# Altium footprint library WR-TBL_Rising Cage Clamp.PcbLib: 435 footprints (part 13 of 28)
Each footprint in its own frame and in the unit in brackets; x right, y up, seen from the top. Pads: shape width x height; smd on the part's side, far side on the other; paste and mask are expansions set on the pad; w line width, h text height; cw(c..) or ccw(c..) is an arc to the next point about the centre after c.
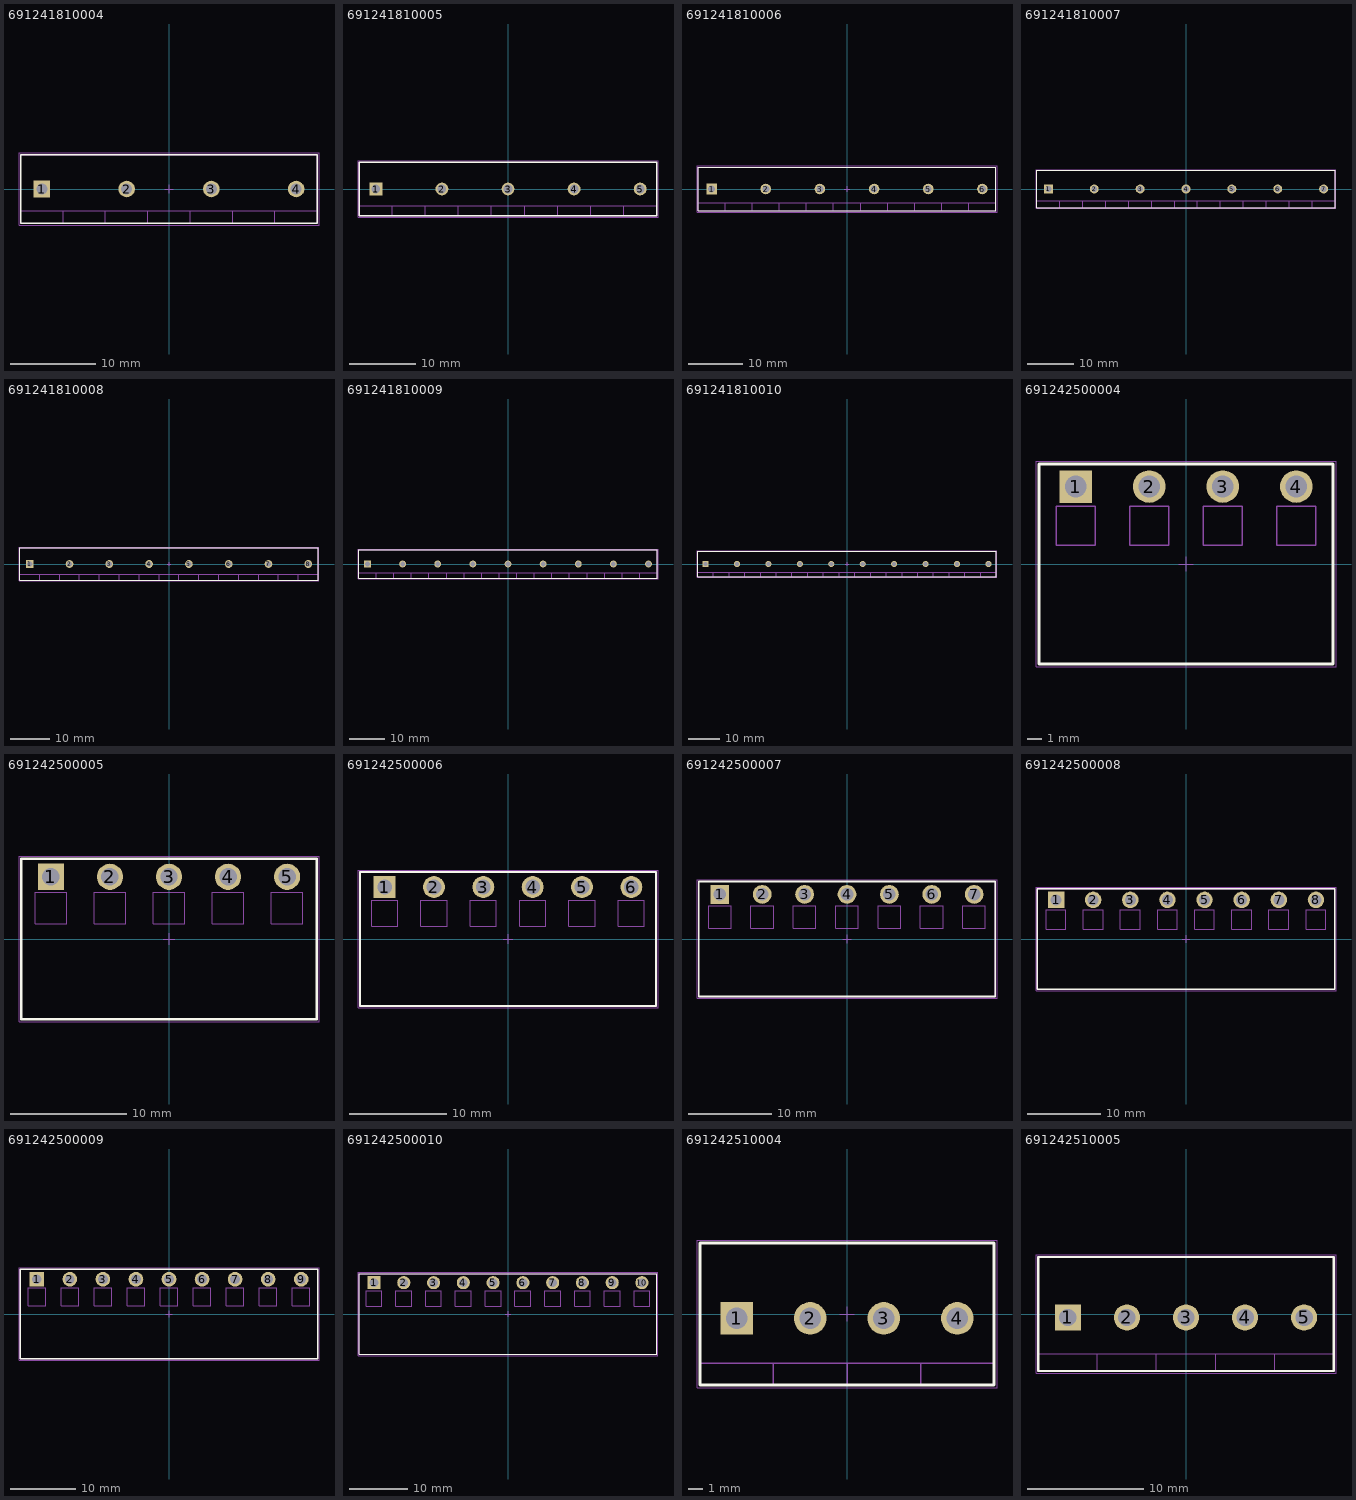
[diagram p12: the footprints below, top view; thin cyan lines are the x and y axes]

## 691241810004 [mm] "10.00mm Horizontal Cable Entry with Rising Cage Clamp, 04p"
height 10
pads (4):
  rect 1.95x1.95 hole 1.3: 1(-15,0)
  round 1.95 hole 1.3: 2(-5,0) 3(5,0) 4(15,0)
Top Overlay:
  lines w0.2: -17.5,-4.05 -17.5,4.05 17.5,4.05 17.5,-4.05 -17.5,-4.05
Mechanical 13:
  lines w0.1: -17.5,-2.55 17.5,-2.55 ; -12.5,-4.05 -12.5,-2.55 ; -7.5,-4.05 -7.5,-2.55 ; -2.5,-4.05 -2.5,-2.55 ; 2.5,-4.05 2.5,-2.55 ; 7.5,-4.05 7.5,-2.55 ; 12.5,-4.05 12.5,-2.55 ; -17.5,-4.05 17.5,-4.05 17.5,4.05 -17.5,4.05 -17.5,-4.05
Mechanical 15:
  lines w0.05: -0.5,0 0.5,0 ; 0,-0.5 0,0.5 ; -17.7,-4.25 -17.7,4.25 17.7,4.25 17.7,-4.25 -17.7,-4.25
3D body "691241810004.stp": height 10.1, standoff -3.4, extent -17.5,-4.05 17.5,4.05

## 691241810005 [mm] "10.00mm Horizontal Cable Entry with Rising Cage Clamp, 05p"
height 10
pads (5):
  rect 1.95x1.95 hole 1.3: 1(-20,0)
  round 1.95 hole 1.3: 2(-10,0) 3(0,0) 4(10,0) 5(20,0)
Top Overlay:
  lines w0.2: -22.5,-4.05 22.5,-4.05 22.5,4.05 -22.5,4.05 -22.5,-4.05
Mechanical 13:
  lines w0.1: -22.5,-2.55 22.5,-2.55 ; -17.5,-4.05 -17.5,-2.55 ; -12.5,-4.05 -12.5,-2.55 ; -7.5,-4.05 -7.5,-2.55 ; -2.5,-4.05 -2.5,-2.55 ; 2.5,-4.05 2.5,-2.55 ; 7.5,-4.05 7.5,-2.55 ; 12.5,-4.05 12.5,-2.55 ; 17.5,-4.05 17.5,-2.55 ; -22.5,-4.05 -22.5,4.05 22.5,4.05 22.5,-4.05 -22.5,-4.05
Mechanical 15:
  lines w0.05: -0.5,0 0.5,0 ; 0,-0.5 0,0.5 ; -22.7,-4.25 22.7,-4.25 22.7,4.25 -22.7,4.25 -22.7,-4.25
3D body "691241810005.stp": height 10.1, standoff -3.4, extent -22.5,-4.05 22.5,4.05

## 691241810006 [mm] "10.00mm Horizontal Cable Entry with Rising Cage Clamp, 06p"
height 10
pads (6):
  rect 1.95x1.95 hole 1.3: 1(-25,0)
  round 1.95 hole 1.3: 2(-15,0) 3(-5,0) 4(5,0) 5(15,0) 6(25,0)
Top Overlay:
  lines w0.2: -27.5,-4.05 -27.5,4.05 27.5,4.05 27.5,-4.05 -27.5,-4.05
Mechanical 13:
  lines w0.1: -27.5,-2.55 27.5,-2.55 ; -22.5,-4.05 -22.5,-2.55 ; -17.5,-4.05 -17.5,-2.55 ; -12.5,-4.05 -12.5,-2.55 ; -7.5,-4.05 -7.5,-2.55 ; -2.5,-4.05 -2.5,-2.55 ; 2.5,-4.05 2.5,-2.55 ; 7.5,-4.05 7.5,-2.55 ; 12.5,-4.05 12.5,-2.55 ; 17.5,-4.05 17.5,-2.55 ; 22.5,-4.05 22.5,-2.55 ; -27.5,-4.05 27.5,-4.05 27.5,4.05 -27.5,4.05 -27.5,-4.05
Mechanical 15:
  lines w0.05: -0.5,0 0.5,0 ; 0,-0.5 0,0.5 ; -27.7,-4.25 -27.7,4.25 27.7,4.25 27.7,-4.25 -27.7,-4.25
3D body "691241810006.stp": height 10.1, standoff -3.4, extent -27.5,-4.05 27.5,4.05

## 691241810007 [mm] "10.00mm Horizontal Cable Entry with Rising Cage Clamp, 07p"
height 10
pads (7):
  rect 1.95x1.95 hole 1.3: 1(-30,0)
  round 1.95 hole 1.3: 2(-20,0) 3(-10,0) 4(0,0) 5(10,0) 6(20,0) 7(30,0)
Top Overlay:
  lines w0.2: -32.5,-4.05 32.5,-4.05 32.5,4.05 -32.5,4.05 -32.5,-4.05
Mechanical 13:
  lines w0.1: -32.5,-2.55 32.5,-2.55 ; -27.5,-4.05 -27.5,-2.55 ; -22.5,-4.05 -22.5,-2.55 ; -17.5,-4.05 -17.5,-2.55 ; -12.5,-4.05 -12.5,-2.55 ; -7.5,-4.05 -7.5,-2.55 ; -2.5,-4.05 -2.5,-2.55 ; 2.5,-4.05 2.5,-2.55 ; 7.5,-4.05 7.5,-2.55 ; 12.5,-4.05 12.5,-2.55 ; 17.5,-4.05 17.5,-2.55 ; 22.5,-4.05 22.5,-2.55 ; 27.5,-4.05 27.5,-2.55 ; -32.5,-4.05 -32.5,4.05 32.5,4.05 32.5,-4.05 -32.5,-4.05
Mechanical 15:
  lines w0.05: -0.5,0 0.5,0 ; 0,-0.5 0,0.5 ; -32.7,-4.25 32.7,-4.25 32.7,4.25 -32.7,4.25 -32.7,-4.25
3D body "691241810007.stp": height 10.1, standoff -3.4, extent -32.5,-4.05 32.5,4.05

## 691241810008 [mm] "10.00mm Horizontal Cable Entry with Rising Cage Clamp, 08p"
height 10
pads (8):
  rect 1.95x1.95 hole 1.3: 1(-35,0)
  round 1.95 hole 1.3: 2(-25,0) 3(-15,0) 4(-5,0) 5(5,0) 6(15,0) 7(25,0) 8(35,0)
Top Overlay:
  lines w0.2: -37.5,-4.05 37.5,-4.05 37.5,4.05 -37.5,4.05 -37.5,-4.05
Mechanical 13:
  lines w0.1: -37.5,-2.55 37.5,-2.55 ; -32.5,-4.05 -32.5,-2.55 ; -27.5,-4.05 -27.5,-2.55 ; -22.5,-4.05 -22.5,-2.55 ; -17.5,-4.05 -17.5,-2.55 ; -12.5,-4.05 -12.5,-2.55 ; -7.5,-4.05 -7.5,-2.55 ; -2.5,-4.05 -2.5,-2.55 ; 2.5,-4.05 2.5,-2.55 ; 7.5,-4.05 7.5,-2.55 ; 12.5,-4.05 12.5,-2.55 ; 17.5,-4.05 17.5,-2.55 ; 22.5,-4.05 22.5,-2.55 ; 27.5,-4.05 27.5,-2.55 ; 32.5,-4.05 32.5,-2.55 ; -37.5,-4.05 -37.5,4.05 37.5,4.05 37.5,-4.05 -37.5,-4.05
Mechanical 15:
  lines w0.05: -0.5,0 0.5,0 ; 0,-0.5 0,0.5 ; -37.7,-4.25 37.7,-4.25 37.7,4.25 -37.7,4.25 -37.7,-4.25
3D body "691241810008.stp": height 10.1, standoff -3.4, extent -37.5,-4.05 37.5,4.05

## 691241810009 [mm] "10.00mm Horizontal Cable Entry with Rising Cage Clamp, 09p"
height 10
pads (9):
  rect 1.95x1.95 hole 1.3: 1(-40,0)
  round 1.95 hole 1.3: 2(-30,0) 3(-20,0) 4(-10,0) 5(0,0) 6(10,0) 7(20,0) 8(30,0) 9(40,0)
Top Overlay:
  lines w0.2: -42.5,-4.05 42.5,-4.05 42.5,4.05 -42.5,4.05 -42.5,-4.05
Mechanical 13:
  lines w0.1: -42.5,-2.55 42.5,-2.55 ; -37.5,-4.05 -37.5,-2.55 ; -32.5,-4.05 -32.5,-2.55 ; -27.5,-4.05 -27.5,-2.55 ; -22.5,-4.05 -22.5,-2.55 ; -17.5,-4.05 -17.5,-2.55 ; -12.5,-4.05 -12.5,-2.55 ; -7.5,-4.05 -7.5,-2.55 ; -2.5,-4.05 -2.5,-2.55 ; 2.5,-4.05 2.5,-2.55 ; 7.5,-4.05 7.5,-2.55 ; 12.5,-4.05 12.5,-2.55 ; 17.5,-4.05 17.5,-2.55 ; 22.5,-4.05 22.5,-2.55 ; 27.5,-4.05 27.5,-2.55 ; 32.5,-4.05 32.5,-2.55 ; 37.5,-4.05 37.5,-2.55 ; -42.5,-4.05 -42.5,4.05 42.5,4.05 42.5,-4.05 -42.5,-4.05
Mechanical 15:
  lines w0.05: -0.5,0 0.5,0 ; 0,-0.5 0,0.5 ; -42.7,-4.25 42.7,-4.25 42.7,4.25 -42.7,4.25 -42.7,-4.25
3D body "691241810009.stp": height 10.1, standoff -3.4, extent -42.5,-4.05 42.5,4.05

## 691241810010 [mm] "10.00mm Horizontal Cable Entry with Rising Cage Clamp, 10p"
height 10
pads (10):
  rect 1.95x1.95 hole 1.3: 1(-45,0)
  round 1.95 hole 1.3: 2(-35,0) 3(-25,0) 4(-15,0) 5(-5,0) 6(5,0) 7(15,0) 8(25,0) 9(35,0) 10(45,0)
Top Overlay:
  lines w0.2: -47.5,-4.05 47.5,-4.05 47.5,4.05 -47.5,4.05 -47.5,-4.05
Mechanical 13:
  lines w0.1: -47.5,-2.55 47.5,-2.55 ; -42.5,-4.05 -42.5,-2.55 ; -37.5,-4.05 -37.5,-2.55 ; -32.5,-4.05 -32.5,-2.55 ; -27.5,-4.05 -27.5,-2.55 ; -22.5,-4.05 -22.5,-2.55 ; -17.5,-4.05 -17.5,-2.55 ; -12.5,-4.05 -12.5,-2.55 ; -7.5,-4.05 -7.5,-2.55 ; -2.5,-4.05 -2.5,-2.55 ; 2.5,-4.05 2.5,-2.55 ; 7.5,-4.05 7.5,-2.55 ; 12.5,-4.05 12.5,-2.55 ; 17.5,-4.05 17.5,-2.55 ; 22.5,-4.05 22.5,-2.55 ; 27.5,-4.05 27.5,-2.55 ; 32.5,-4.05 32.5,-2.55 ; 37.5,-4.05 37.5,-2.55 ; 42.5,-4.05 42.5,-2.55 ; -47.5,-4.05 -47.5,4.05 47.5,4.05 47.5,-4.05 -47.5,-4.05
Mechanical 15:
  lines w0.05: -0.5,0 0.5,0 ; 0,-0.5 0,0.5 ; -47.7,-4.25 47.7,-4.25 47.7,4.25 -47.7,4.25 -47.7,-4.25
3D body "691241810010.stp": height 10.1, standoff -3.4, extent -47.5,-4.05 47.5,4.05

## 691242500004 [mm] "Serie 2425-5.08mm Vertical Cable Entry with Rising Cage Clamp, 4 pins"
height 9
pads (4):
  rect 2.25x2.25 hole 1.5: 1(-7.62,5.35)
  round 2.25 hole 1.5: 2(-2.54,5.35) 3(2.54,5.35) 4(7.62,5.35)
Top Overlay:
  lines w0.2: -10.16,-6.9 10.16,-6.9 10.16,6.9 -10.16,6.9 -10.16,-6.9
Mechanical 13:
  lines w0.1: -10.16,-6.9 -10.16,6.9 10.16,6.9 10.16,-6.9 -10.16,-6.9 ; -8.97,1.3 -8.97,4 -6.27,4 -6.27,1.3 -8.97,1.3 ; -3.89,1.3 -1.19,1.3 -1.19,4 -3.89,4 -3.89,1.3 ; 1.19,1.3 3.89,1.3 3.89,4 1.19,4 1.19,1.3 ; 6.27,1.3 8.97,1.3 8.97,4 6.27,4 6.27,1.3
Mechanical 15:
  lines w0.05: -0.5,0 0.5,0 ; 0,-0.5 0,0.5 ; -10.36,-7.1 10.36,-7.1 10.36,7.1 -10.36,7.1 -10.36,-7.1
3D body "691242500004.stp": height 9.9, standoff -3.4, extent -10.16,-6.9 10.16,6.9

## 691242500005 [mm] "Serie 2425-5.08mm Vertical Cable Entry with Rising Cage Clamp, 5 pins"
height 9
pads (5):
  rect 2.25x2.25 hole 1.5: 1(-10.16,5.35)
  round 2.25 hole 1.5: 2(-5.08,5.35) 3(0,5.35) 4(5.08,5.35) 5(10.16,5.35)
Top Overlay:
  lines w0.2: -12.7,-6.9 12.7,-6.9 12.7,6.9 -12.7,6.9 -12.7,-6.9
Mechanical 13:
  lines w0.1: -12.7,-6.9 -12.7,6.9 12.7,6.9 12.7,-6.9 -12.7,-6.9 ; -11.51,1.3 -11.51,4 -8.81,4 -8.81,1.3 -11.51,1.3 ; -6.43,1.3 -3.73,1.3 -3.73,4 -6.43,4 -6.43,1.3 ; -1.35,1.3 1.35,1.3 1.35,4 -1.35,4 -1.35,1.3 ; 3.73,1.3 6.43,1.3 6.43,4 3.73,4 3.73,1.3 ; 8.81,1.3 8.81,4 11.51,4 11.51,1.3 8.81,1.3
Mechanical 15:
  lines w0.05: -0.5,0 0.5,0 ; 0,-0.5 0,0.5 ; -12.9,-7.1 12.9,-7.1 12.9,7.1 -12.9,7.1 -12.9,-7.1
3D body "691242500005.stp": height 9.9, standoff -3.4, extent -12.7,-6.9 12.71,6.9

## 691242500006 [mm] "Serie 2425-5.08mm Vertical Cable Entry with Rising Cage Clamp, 6 pins"
height 9
pads (6):
  rect 2.25x2.25 hole 1.5: 1(-12.7,5.35)
  round 2.25 hole 1.5: 2(-7.62,5.35) 3(-2.54,5.35) 4(2.54,5.35) 5(7.62,5.35) 6(12.7,5.35)
Top Overlay:
  lines w0.2: -15.24,-6.9 -15.24,6.9 15.24,6.9 15.24,-6.9 -15.24,-6.9
Mechanical 13:
  lines w0.1: -15.24,-6.9 15.24,-6.9 15.24,6.9 -15.24,6.9 -15.24,-6.9 ; -14.05,1.3 -11.35,1.3 -11.35,4 -14.05,4 -14.05,1.3 ; -8.97,1.3 -8.97,4 -6.27,4 -6.27,1.3 -8.97,1.3 ; -3.89,1.3 -3.89,4 -1.19,4 -1.19,1.3 -3.89,1.3 ; 1.19,1.3 1.19,4 3.89,4 3.89,1.3 1.19,1.3 ; 6.27,1.3 8.97,1.3 8.97,4 6.27,4 6.27,1.3 ; 11.35,1.3 11.35,4 14.05,4 14.05,1.3 11.35,1.3
Mechanical 15:
  lines w0.05: -0.5,0 0.5,0 ; 0,-0.5 0,0.5 ; -15.44,-7.1 -15.44,7.1 15.44,7.1 15.44,-7.1 -15.44,-7.1
3D body "691242500006.stp": height 9.9, standoff -3.4, extent -15.24,-6.9 15.25,6.9

## 691242500007 [mm] "Serie 2425-5.08mm Vertical Cable Entry with Rising Cage Clamp, 7 pins"
height 9
pads (7):
  rect 2.25x2.25 hole 1.5: 1(-15.24,5.35)
  round 2.25 hole 1.5: 2(-10.16,5.35) 3(-5.08,5.35) 4(0,5.35) 5(5.08,5.35) 6(10.16,5.35) 7(15.24,5.35)
Top Overlay:
  lines w0.2: -17.78,-6.9 -17.78,6.9 17.78,6.9 17.78,-6.9 -17.78,-6.9
Mechanical 13:
  lines w0.1: -17.78,-6.9 17.78,-6.9 17.78,6.9 -17.78,6.9 -17.78,-6.9 ; -16.59,1.3 -13.89,1.3 -13.89,4 -16.59,4 -16.59,1.3 ; -11.51,1.3 -11.51,4 -8.81,4 -8.81,1.3 -11.51,1.3 ; -6.43,1.3 -6.43,4 -3.73,4 -3.73,1.3 -6.43,1.3 ; -1.35,1.3 -1.35,4 1.35,4 1.35,1.3 -1.35,1.3 ; 3.73,1.3 6.43,1.3 6.43,4 3.73,4 3.73,1.3 ; 8.81,1.3 8.81,4 11.51,4 11.51,1.3 8.81,1.3 ; 13.89,1.3 16.59,1.3 16.59,4 13.89,4 13.89,1.3
Mechanical 15:
  lines w0.05: -0.5,0 0.5,0 ; 0,-0.5 0,0.5 ; -17.98,-7.1 -17.98,7.1 17.98,7.1 17.98,-7.1 -17.98,-7.1
3D body "691242500007.stp": height 9.9, standoff -3.4, extent -17.78,-6.9 17.79,6.9

## 691242500008 [mm] "Serie 2425-5.08mm Vertical Cable Entry with Rising Cage Clamp, 8 pins"
height 9
pads (8):
  rect 2.25x2.25 hole 1.5: 1(-17.78,5.35)
  round 2.25 hole 1.5: 2(-12.7,5.35) 3(-7.62,5.35) 4(-2.54,5.35) 5(2.54,5.35) 6(7.62,5.35) 7(12.7,5.35) 8(17.78,5.35)
Top Overlay:
  lines w0.2: -20.32,-6.9 -20.32,6.9 20.32,6.9 20.32,-6.9 -20.32,-6.9
Mechanical 13:
  lines w0.1: -20.32,-6.9 20.32,-6.9 20.32,6.9 -20.32,6.9 -20.32,-6.9 ; -19.13,1.3 -16.43,1.3 -16.43,4 -19.13,4 -19.13,1.3 ; -14.05,1.3 -14.05,4 -11.35,4 -11.35,1.3 -14.05,1.3 ; -8.97,1.3 -8.97,4 -6.27,4 -6.27,1.3 -8.97,1.3 ; -3.89,1.3 -3.89,4 -1.19,4 -1.19,1.3 -3.89,1.3 ; 1.19,1.3 3.89,1.3 3.89,4 1.19,4 1.19,1.3 ; 6.27,1.3 6.27,4 8.97,4 8.97,1.3 6.27,1.3 ; 11.35,1.3 14.05,1.3 14.05,4 11.35,4 11.35,1.3 ; 16.43,1.3 16.43,4 19.13,4 19.13,1.3 16.43,1.3
Mechanical 15:
  lines w0.05: -0.5,0 0.5,0 ; 0,-0.5 0,0.5 ; -20.52,-7.1 -20.52,7.1 20.52,7.1 20.52,-7.1 -20.52,-7.1
3D body "691242500008.stp": height 9.9, standoff -3.4, extent -20.32,-6.9 20.33,6.9

## 691242500009 [mm] "Serie 2425-5.08mm Vertical Cable Entry with Rising Cage Clamp, 9 pins"
height 9
pads (9):
  rect 2.25x2.25 hole 1.5: 1(-20.32,5.35)
  round 2.25 hole 1.5: 2(-15.24,5.35) 3(-10.16,5.35) 4(-5.08,5.35) 5(0,5.35) 6(5.08,5.35) 7(10.16,5.35) 8(15.24,5.35) 9(20.32,5.35)
Top Overlay:
  lines w0.2: -22.86,-6.9 22.86,-6.9 22.86,6.9 -22.86,6.9 -22.86,-6.9
Mechanical 13:
  lines w0.1: -22.86,-6.9 -22.86,6.9 22.86,6.9 22.86,-6.9 -22.86,-6.9 ; -21.67,1.3 -21.67,4 -18.97,4 -18.97,1.3 -21.67,1.3 ; -16.59,1.3 -13.89,1.3 -13.89,4 -16.59,4 -16.59,1.3 ; -11.51,1.3 -8.81,1.3 -8.81,4 -11.51,4 -11.51,1.3 ; -6.43,1.3 -3.73,1.3 -3.73,4 -6.43,4 -6.43,1.3 ; -1.35,1.3 -1.35,4 1.35,4 1.35,1.3 -1.35,1.3 ; 3.73,1.3 6.43,1.3 6.43,4 3.73,4 3.73,1.3 ; 8.81,1.3 8.81,4 11.51,4 11.51,1.3 8.81,1.3 ; 13.89,1.3 16.59,1.3 16.59,4 13.89,4 13.89,1.3 ; 18.97,1.3 18.97,4 21.67,4 21.67,1.3 18.97,1.3
Mechanical 15:
  lines w0.05: -0.5,0 0.5,0 ; 0,-0.5 0,0.5 ; -23.06,-7.1 23.06,-7.1 23.06,7.1 -23.06,7.1 -23.06,-7.1
3D body "691242500009.stp": height 9.9, standoff -3.4, extent -22.86,-6.9 22.87,6.9

## 691242500010 [mm] "Serie 2425-5.08mm Vertical Cable Entry with Rising Cage Clamp, 10 pins"
height 9
pads (10):
  rect 2.25x2.25 hole 1.5: 1(-22.86,5.35)
  round 2.25 hole 1.5: 2(-17.78,5.35) 3(-12.7,5.35) 4(-7.62,5.35) 5(-2.54,5.35) 6(2.54,5.35) 7(7.62,5.35) 8(12.7,5.35) 9(17.78,5.35) 10(22.86,5.35)
Top Overlay:
  lines w0.2: -25.4,-6.9 25.4,-6.9 25.4,6.9 -25.4,6.9 -25.4,-6.9
Mechanical 13:
  lines w0.1: -25.4,-6.9 -25.4,6.9 25.4,6.9 25.4,-6.9 -25.4,-6.9 ; -24.21,1.3 -24.21,4 -21.51,4 -21.51,1.3 -24.21,1.3 ; -19.13,1.3 -16.43,1.3 -16.43,4 -19.13,4 -19.13,1.3 ; -14.05,1.3 -11.35,1.3 -11.35,4 -14.05,4 -14.05,1.3 ; -8.97,1.3 -6.27,1.3 -6.27,4 -8.97,4 -8.97,1.3 ; -3.89,1.3 -3.89,4 -1.19,4 -1.19,1.3 -3.89,1.3 ; 1.19,1.3 3.89,1.3 3.89,4 1.19,4 1.19,1.3 ; 6.27,1.3 6.27,4 8.97,4 8.97,1.3 6.27,1.3 ; 11.35,1.3 14.05,1.3 14.05,4 11.35,4 11.35,1.3 ; 16.43,1.3 16.43,4 19.13,4 19.13,1.3 16.43,1.3 ; 21.51,1.3 24.21,1.3 24.21,4 21.51,4 21.51,1.3
Mechanical 15:
  lines w0.05: -0.5,0 0.5,0 ; 0,-0.5 0,0.5 ; -25.6,-7.1 25.6,-7.1 25.6,7.1 -25.6,7.1 -25.6,-7.1
3D body "691242500010.stp": height 9.9, standoff -3.4, extent -25.4,-6.9 25.41,6.9

## 691242510004 [mm] "Serie 2425 - 5.08 mm _ 4 pins"
height 13.8
pads (4):
  rect 2.25x2.25 hole 1.5: 1(-7.62,-0.3)
  round 2.25 hole 1.5: 2(-2.54,-0.3) 3(2.54,-0.3) 4(7.62,-0.3)
Top Overlay:
  lines w0.2: -10.16,-4.9 -10.16,4.9 10.16,4.9 10.16,-4.9 -10.16,-4.9
Mechanical 13:
  lines w0.1: -10.16,-3.4 10.16,-3.4 ; -5.08,-4.9 -5.08,-3.4 ; 0,-4.9 0,-3.4 ; 5.08,-4.9 5.08,-3.4 ; -10.16,-4.9 10.16,-4.9 10.16,4.9 -10.16,4.9 -10.16,-4.9
Mechanical 15:
  lines w0.05: -0.5,0 0.5,0 ; 0,-0.5 0,0.5 ; -10.36,-5.1 10.36,-5.1 10.36,5.1 -10.36,5.1 -10.36,-5.1
3D body "691242510004.stp": height 13.85, standoff -3.45, extent -10.16,-4.9 10.16,4.9

## 691242510005 [mm] "Serie 2425 - 5.08 mm _ 5 pins"
height 13.8
pads (5):
  rect 2.25x2.25 hole 1.5: 1(-10.16,-0.3)
  round 2.25 hole 1.5: 2(-5.08,-0.3) 3(0,-0.3) 4(5.08,-0.3) 5(10.16,-0.3)
Top Overlay:
  lines w0.2: -12.7,-4.9 12.7,-4.9 12.7,4.9 -12.7,4.9 -12.7,-4.9
Mechanical 13:
  lines w0.1: -12.7,-3.4 12.7,-3.4 ; -7.62,-4.9 -7.62,-3.4 ; -2.54,-4.9 -2.54,-3.4 ; 2.54,-4.9 2.54,-3.4 ; 7.62,-4.9 7.62,-3.4 ; -12.7,-4.9 -12.7,4.9 12.7,4.9 12.7,-4.9 -12.7,-4.9
Mechanical 15:
  lines w0.05: -0.5,0 0.5,0 ; 0,-0.5 0,0.5 ; -12.9,-5.1 -12.9,5.1 12.9,5.1 12.9,-5.1 -12.9,-5.1
3D body "691242510005.stp": height 13.85, standoff -3.45, extent -12.7,-4.9 12.7,4.9